# Altium footprint library Cap.PcbLib: 102 footprints (part 5 of 7)
Each footprint in its own frame and in the unit in brackets; x right, y up, seen from the top. Pads: shape width x height; smd on the part's side, far side on the other; paste and mask are expansions set on the pad; w line width, h text height; cw(c..) or ccw(c..) is an arc to the next point about the centre after c.
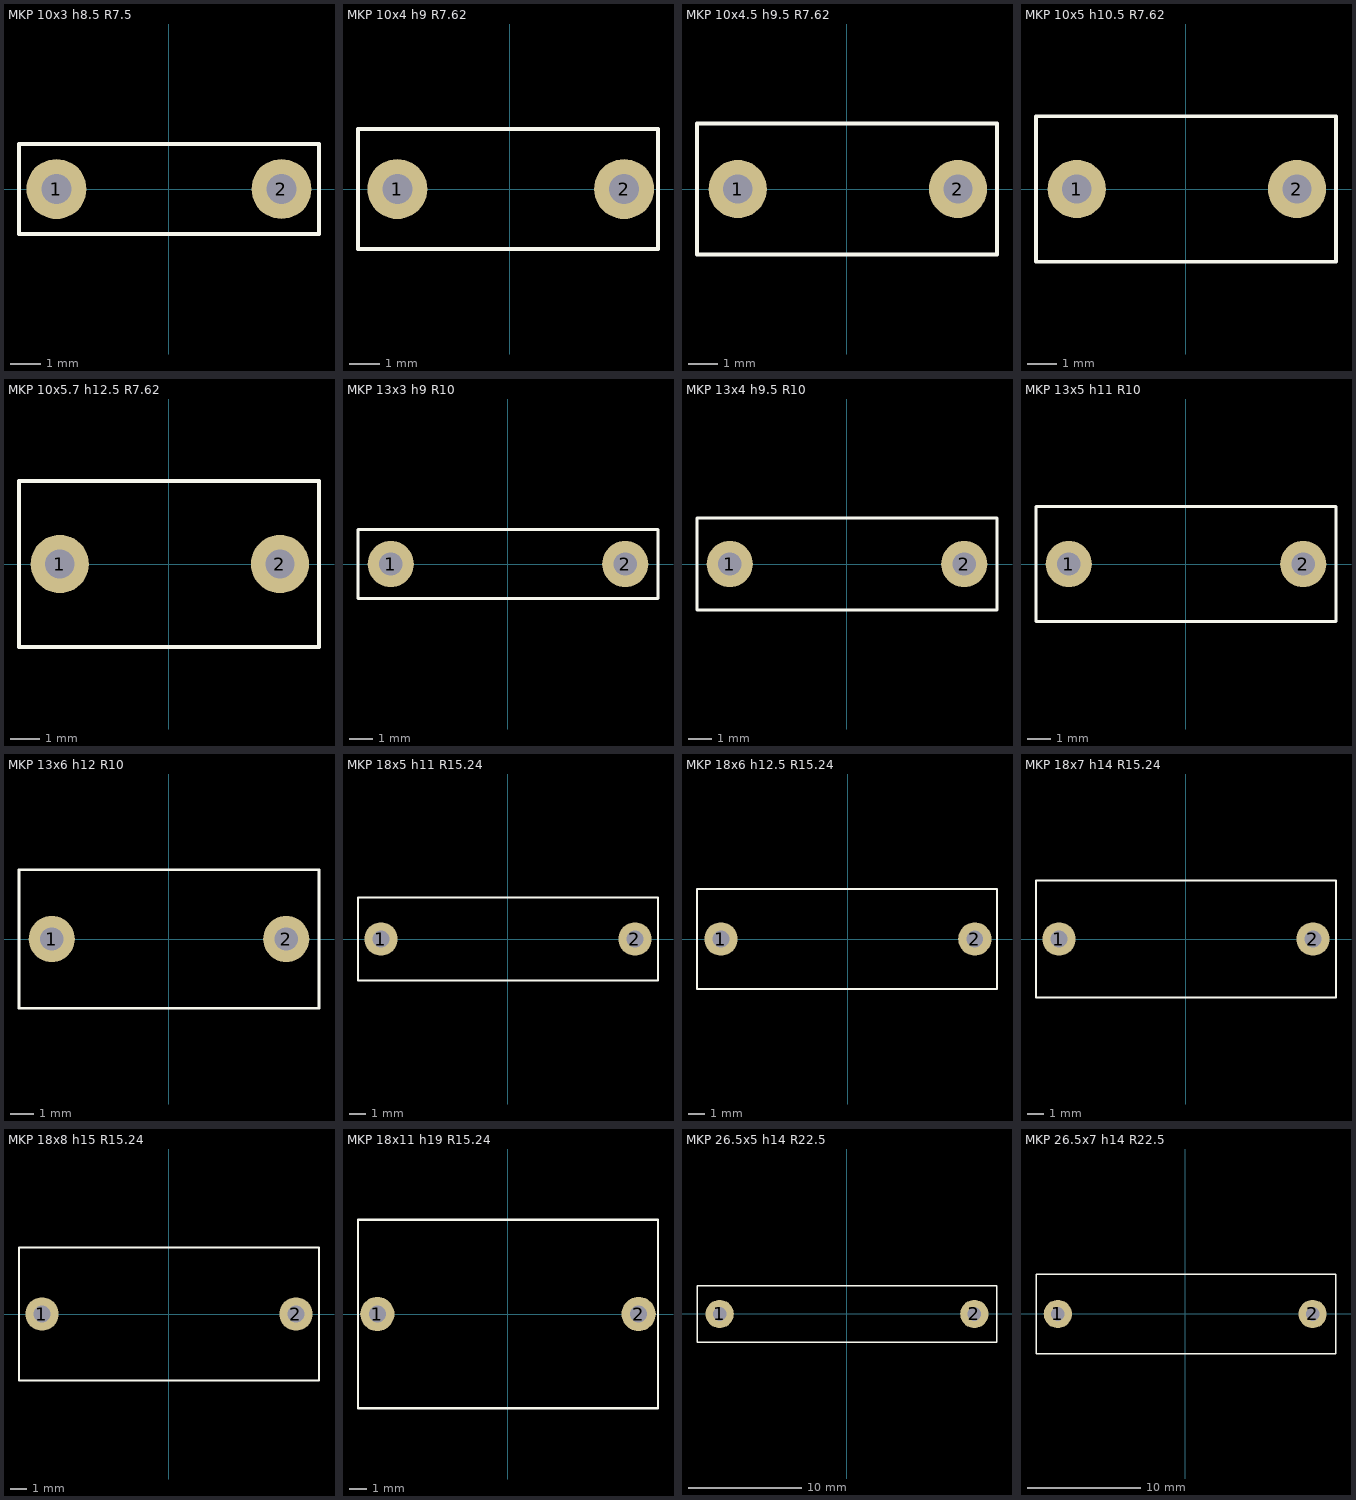
[diagram p4: the footprints below, top view; thin cyan lines are the x and y axes]

## MKP 10x3 h8.5 R7.5 [mm]
pads (2):
  round 2 hole 1: 1(-3.75,0) 2(3.75,0)
TopOverlay:
  lines w0.127: -5,-1.5 5,-1.5 5,1.5 -5,1.5 -5,-1.5
3D body "MKP 10x3 h8.5 R7.5.STEP": height 8.5, standoff -2.54, extent -5,-1.5 5,1.5

## MKP 10x4 h9 R7.62 [mm]
pads (2):
  round 2 hole 1: 1(-3.75,0) 2(3.81,0)
TopOverlay:
  lines w0.127: -5.06,-2 -5.06,2 4.94,2 4.94,-2 -5.06,-2
3D body "MKP 10x4 h9 R7.62.STEP": height 9, standoff -2.54, extent -5,-2 5,2

## MKP 10x4.5 h9.5 R7.62 [mm]
pads (2):
  round 2 hole 1: 1(-3.75,0) 2(3.81,0)
TopOverlay:
  lines w0.127: -5.15,-2.25 5.15,-2.25 5.15,2.25 -5.15,2.25 -5.15,-2.25
3D body "MKP 10x4.5 h9.5 R7.62.STEP": height 9.5, standoff -2.54, extent -5.15,-2.25 5.15,2.25

## MKP 10x5 h10.5 R7.62 [mm]
pads (2):
  round 2 hole 1: 1(-3.75,0) 2(3.81,0)
TopOverlay:
  lines w0.127: -5.15,-2.5 -5.15,2.5 5.15,2.5 5.15,-2.5 -5.15,-2.5
3D body "MKP 10x5 h10.5 R7.62.STEP": height 10.5, standoff -2.54, extent -5.15,-2.5 5.15,2.5

## MKP 10x5.7 h12.5 R7.62 [mm]
pads (2):
  round 2 hole 1: 1(-3.75,0) 2(3.81,0)
TopOverlay:
  lines w0.127: -5.15,-2.85 5.15,-2.85 5.15,2.85 -5.15,2.85 -5.15,-2.85
3D body "MKP 10x5.7 h12.5 R7.62.STEP": height 12.5, standoff -2.54, extent -5.15,-2.85 5.15,2.85

## MKP 13x3 h9 R10 [mm]
pads (2):
  round 2 hole 1: 1(-5.08,0) 2(5.08,0)
TopOverlay:
  lines w0.127: -6.5,-1.5 6.5,-1.5 6.5,1.5 -6.5,1.5 -6.5,-1.5
3D body "MKP 13x3 h9 R10.STEP": height 9, standoff -2.54, extent -6.5,-1.5 6.5,1.5

## MKP 13x4 h9.5 R10 [mm]
pads (2):
  round 2 hole 1: 1(-5.08,0) 2(5.08,0)
TopOverlay:
  lines w0.127: -6.5,-2 -6.5,2 6.5,2 6.5,-2 -6.5,-2
3D body "MKP 13x4 h9.5 R10.STEP": height 9.5, standoff -2.54, extent -6.5,-2 6.5,2

## MKP 13x5 h11 R10 [mm]
pads (2):
  round 2 hole 1: 1(-5.08,0) 2(5.08,0)
TopOverlay:
  lines w0.127: -6.5,-2.5 -6.5,2.5 6.5,2.5 6.5,-2.5 -6.5,-2.5
3D body "MKP 13x5 h11 R10.STEP": height 11, standoff -2.54, extent -6.5,-2.5 6.5,2.5

## MKP 13x6 h12 R10 [mm]
pads (2):
  round 2 hole 1: 1(-5.08,0) 2(5.08,0)
TopOverlay:
  lines w0.127: -6.5,-3 6.5,-3 6.5,3 -6.5,3 -6.5,-3
3D body "MKP 13x6 h12 R10.STEP": height 12, standoff -2.54, extent -6.5,-3 6.5,3

## MKP 18x5 h11 R15.24 [mm]
pads (2):
  round 2 hole 1: 1(-7.62,0) 2(7.62,0)
TopOverlay:
  lines w0.127: -9,-2.5 9,-2.5 9,2.5 -9,2.5 -9,-2.5
3D body "MKP 18x5 h111 R15.24.STEP": height 11, standoff -2.54, extent -9,-2.5 9,2.5

## MKP 18x6 h12.5 R15.24 [mm]
pads (2):
  round 2 hole 1: 1(-7.62,0) 2(7.62,0)
TopOverlay:
  lines w0.127: -9.06,-3 -9.06,3 8.95,3 8.95,-3 -9.06,-3
3D body "MKP 18x6 h12.5 R15.24.STEP": height 12.5, standoff -2.54, extent -9,-3 9,3

## MKP 18x7 h14 R15.24 [mm]
pads (2):
  round 2 hole 1: 1(-7.62,0) 2(7.62,0)
TopOverlay:
  lines w0.127: -9,-3.5 9,-3.5 9,3.5 -9,3.5 -9,-3.5
3D body "MKP 18x7 h14 R15.24.STEP": height 14, standoff -2.54, extent -9,-3.5 9,3.5

## MKP 18x8 h15 R15.24 [mm]
pads (2):
  round 2 hole 1: 1(-7.62,0) 2(7.62,0)
TopOverlay:
  lines w0.127: -9,-4 9,-4 9,4 -9,4 -9,-4
3D body "MKP 18x8 h15 R15.24.STEP": height 15, standoff -2.54, extent -9,-4 9,4

## MKP 18x11 h19 R15.24 [mm]
pads (2):
  round 2 hole 1: 1(-7.62,0) 2(7.62,0)
TopOverlay:
  lines w0.127: -8.75,-5.5 8.75,-5.5 8.75,5.5 -8.75,5.5 -8.75,-5.5
3D body "MKP 18x11 h19 F15.24.STEP": height 19, standoff -2.54, extent -8.75,-5.5 8.75,5.5

## MKP 26.5x5 h14 R22.5 [mm]
pads (2):
  round 2.5 hole 1.2: 1(-11.25,0) 2(11.25,0)
TopOverlay:
  lines w0.127: -13.25,-2.5 -13.25,2.5 13.25,2.5 13.25,-2.5 -13.25,-2.5
3D body "MKP 26.5x5 h14 R22.5.STEP": height 14, standoff -2.54, extent -13.25,-2.5 13.25,2.5

## MKP 26.5x7 h14 R22.5 [mm]
pads (2):
  round 2.5 hole 1.2: 1(-11.25,0) 2(11.25,0)
TopOverlay:
  lines w0.127: -13.18,-3.5 13.32,-3.5 13.32,3.5 -13.18,3.5 -13.18,-3.5
3D body "MKP 26.5x7 h14 R22.5.STEP": height 14, standoff -2.54, extent -13.25,-3.5 13.25,3.5